# Altium schematic symbol library jlcpcb_2025_04_capacitors_extended_0402.schlib: 3594 symbols (part 10 of 20) (continued)
## CGA2B2C0G1H270JT0Y0F
designator C?  Capacitance: 27pF  (hidden comment: *)
Capacitor, Ceramic (MLCC), 27pF, ±5%, 50V, C0G, ±5%, SMD 0402; Manufacturer: TDK; Manufacturer Part Number: CGA2B2C0G1H270JT0Y0F; Package Size: 0402; JLCPCB Basic Part: No; JLCPCB Part Number: C342944; Supplier 1: LCSC; Category: Capacitors - MLCC; Supplier Part Number 1: C342944; Tolerance: ±5%; Voltage Rating: 50V; Temperature Coefficient: C0G; RoHS: Yes; ComponentLink1Description: Datasheet; ComponentLink1URL: https://wmsc.lcsc.com/wmsc/upload/file/pdf/v2/lcsc/2304140030_TDK-CGA2B2C0G1H270JT0Y0F_C342944.pdf; ComponentLink2Description: JLCPCB Part URL; ComponentLink2URL: https://jlcpcb.com/partdetail/C342944; ComponentLink3Description: LCSC Part URL; ComponentLink3URL: https://lcsc.com/product-detail/Multilayer-Ceramic-Capacitors-MLCC---SMD-SMT_TDK-TDK-CGA2B2C0G1H270JT0Y0F_C342944.html
footprint CAP-0402 (0402 (1005M) Capacitor)
pins: 1, 2

## CGA2B2C0G1H271JT0Y0F
designator C?  Capacitance: 270pF  (hidden comment: *)
Capacitor, Ceramic (MLCC), 270pF, ±5%, 50V, C0G, ±5%, SMD 0402; Manufacturer: TDK; Manufacturer Part Number: CGA2B2C0G1H271JT0Y0F; Package Size: 0402; JLCPCB Basic Part: No; JLCPCB Part Number: C695156; Supplier 1: LCSC; Category: Capacitors - MLCC; Supplier Part Number 1: C695156; Tolerance: ±5%; Voltage Rating: 50V; Temperature Coefficient: C0G; RoHS: Yes; ComponentLink1Description: Datasheet; ComponentLink1URL: https://wmsc.lcsc.com/wmsc/upload/file/pdf/v2/lcsc/2008101534_TDK-CGA2B2C0G1H271JT0Y0F_C695156.pdf; ComponentLink2Description: JLCPCB Part URL; ComponentLink2URL: https://jlcpcb.com/partdetail/C695156; ComponentLink3Description: LCSC Part URL; ComponentLink3URL: https://lcsc.com/product-detail/Multilayer-Ceramic-Capacitors-MLCC---SMD-SMT_TDK-TDK-CGA2B2C0G1H271JT0Y0F_C695156.html
footprint CAP-0402 (0402 (1005M) Capacitor)
pins: 1, 2

## CGA2B2C0G1H330JT0Y0F
designator C?  Capacitance: 33pF  (hidden comment: *)
Capacitor, Ceramic (MLCC), 33pF, ±5%, 50V, C0G, ±5%, SMD 0402; Manufacturer: TDK; Manufacturer Part Number: CGA2B2C0G1H330JT0Y0F; Package Size: 0402; JLCPCB Basic Part: No; JLCPCB Part Number: C342945; Supplier 1: LCSC; Category: Capacitors - MLCC; Supplier Part Number 1: C342945; Tolerance: ±5%; Voltage Rating: 50V; Temperature Coefficient: C0G; RoHS: Yes; ComponentLink1Description: Datasheet; ComponentLink1URL: https://wmsc.lcsc.com/wmsc/upload/file/pdf/v2/lcsc/2304140030_TDK-CGA2B2C0G1H330JT0Y0F_C342945.pdf; ComponentLink2Description: JLCPCB Part URL; ComponentLink2URL: https://jlcpcb.com/partdetail/C342945; ComponentLink3Description: LCSC Part URL; ComponentLink3URL: https://lcsc.com/product-detail/Multilayer-Ceramic-Capacitors-MLCC---SMD-SMT_TDK-TDK-CGA2B2C0G1H330JT0Y0F_C342945.html
footprint CAP-0402 (0402 (1005M) Capacitor)
pins: 1, 2

## CGA2B2C0G1H331JT0Y0F
designator C?  Capacitance: 330pF  (hidden comment: *)
Capacitor, Ceramic (MLCC), 330pF, ±5%, 50V, C0G, ±5%, SMD 0402; Manufacturer: TDK; Manufacturer Part Number: CGA2B2C0G1H331JT0Y0F; Package Size: 0402; JLCPCB Basic Part: No; JLCPCB Part Number: C343057; Supplier 1: LCSC; Category: Capacitors - MLCC; Supplier Part Number 1: C343057; Tolerance: ±5%; Voltage Rating: 50V; Temperature Coefficient: C0G; RoHS: Yes; ComponentLink1Description: Datasheet; ComponentLink1URL: https://wmsc.lcsc.com/wmsc/upload/file/pdf/v2/lcsc/2304140030_TDK-CGA2B2C0G1H331JT0Y0F_C343057.pdf; ComponentLink2Description: JLCPCB Part URL; ComponentLink2URL: https://jlcpcb.com/partdetail/C343057; ComponentLink3Description: LCSC Part URL; ComponentLink3URL: https://lcsc.com/product-detail/Multilayer-Ceramic-Capacitors-MLCC---SMD-SMT_TDK-TDK-CGA2B2C0G1H331JT0Y0F_C343057.html
footprint CAP-0402 (0402 (1005M) Capacitor)
pins: 1, 2

## CGA2B2C0G1H390JT0Y0F
designator C?  Capacitance: 39pF  (hidden comment: *)
Capacitor, Ceramic (MLCC), 39pF, ±5%, 50V, C0G, ±5%, SMD 0402; Manufacturer: TDK; Manufacturer Part Number: CGA2B2C0G1H390JT0Y0F; Package Size: 0402; JLCPCB Basic Part: No; JLCPCB Part Number: C342946; Supplier 1: LCSC; Category: Capacitors - MLCC; Supplier Part Number 1: C342946; Tolerance: ±5%; Voltage Rating: 50V; Temperature Coefficient: C0G; RoHS: Yes; ComponentLink1Description: Datasheet; ComponentLink1URL: https://wmsc.lcsc.com/wmsc/upload/file/pdf/v2/lcsc/2304140030_TDK-CGA2B2C0G1H390JT0Y0F_C342946.pdf; ComponentLink2Description: JLCPCB Part URL; ComponentLink2URL: https://jlcpcb.com/partdetail/C342946; ComponentLink3Description: LCSC Part URL; ComponentLink3URL: https://lcsc.com/product-detail/Multilayer-Ceramic-Capacitors-MLCC---SMD-SMT_TDK-TDK-CGA2B2C0G1H390JT0Y0F_C342946.html
footprint CAP-0402 (0402 (1005M) Capacitor)
pins: 1, 2

## CGA2B2C0G1H391JT0Y0F
designator C?  Capacitance: 390pF  (hidden comment: *)
Capacitor, Ceramic (MLCC), 390pF, ±5%, 50V, C0G, ±5%, SMD 0402; Manufacturer: TDK; Manufacturer Part Number: CGA2B2C0G1H391JT0Y0F; Package Size: 0402; JLCPCB Basic Part: No; JLCPCB Part Number: C445767; Supplier 1: LCSC; Category: Capacitors - MLCC; Supplier Part Number 1: C445767; Tolerance: ±5%; Voltage Rating: 50V; Temperature Coefficient: C0G; RoHS: Yes; ComponentLink1Description: Datasheet; ComponentLink1URL: https://wmsc.lcsc.com/wmsc/upload/file/pdf/v2/lcsc/2304140030_TDK-CGA2B2C0G1H391JT0Y0F_C445767.pdf; ComponentLink2Description: JLCPCB Part URL; ComponentLink2URL: https://jlcpcb.com/partdetail/C445767; ComponentLink3Description: LCSC Part URL; ComponentLink3URL: https://lcsc.com/product-detail/Multilayer-Ceramic-Capacitors-MLCC---SMD-SMT_TDK-TDK-CGA2B2C0G1H391JT0Y0F_C445767.html
footprint CAP-0402 (0402 (1005M) Capacitor)
pins: 1, 2

## CGA2B2C0G1H470JT0Y0F
designator C?  Capacitance: 47pF  (hidden comment: *)
Capacitor, Ceramic (MLCC), 47pF, ±5%, 50V, C0G, ±5%, SMD 0402; Manufacturer: TDK; Manufacturer Part Number: CGA2B2C0G1H470JT0Y0F; Package Size: 0402; JLCPCB Basic Part: No; JLCPCB Part Number: C432937; Supplier 1: LCSC; Category: Capacitors - MLCC; Supplier Part Number 1: C432937; Tolerance: ±5%; Voltage Rating: 50V; Temperature Coefficient: C0G; RoHS: Yes; ComponentLink1Description: Datasheet; ComponentLink1URL: https://wmsc.lcsc.com/wmsc/upload/file/pdf/v2/lcsc/2304140030_TDK-CGA2B2C0G1H470JT0Y0F_C432937.pdf; ComponentLink2Description: JLCPCB Part URL; ComponentLink2URL: https://jlcpcb.com/partdetail/C432937; ComponentLink3Description: LCSC Part URL; ComponentLink3URL: https://lcsc.com/product-detail/Multilayer-Ceramic-Capacitors-MLCC---SMD-SMT_TDK-TDK-CGA2B2C0G1H470JT0Y0F_C432937.html
footprint CAP-0402 (0402 (1005M) Capacitor)
pins: 1, 2

## CGA2B2C0G1H471JT0Y0F
designator C?  Capacitance: 470pF  (hidden comment: *)
Capacitor, Ceramic (MLCC), 470pF, ±5%, 50V, C0G, ±5%, SMD 0402; Manufacturer: TDK; Manufacturer Part Number: CGA2B2C0G1H471JT0Y0F; Package Size: 0402; JLCPCB Basic Part: No; JLCPCB Part Number: C445766; Supplier 1: LCSC; Category: Capacitors - MLCC; Supplier Part Number 1: C445766; Tolerance: ±5%; Voltage Rating: 50V; Temperature Coefficient: C0G; RoHS: Yes; ComponentLink1Description: Datasheet; ComponentLink1URL: https://wmsc.lcsc.com/wmsc/upload/file/pdf/v2/lcsc/2304140030_TDK-CGA2B2C0G1H471JT0Y0F_C445766.pdf; ComponentLink2Description: JLCPCB Part URL; ComponentLink2URL: https://jlcpcb.com/partdetail/C445766; ComponentLink3Description: LCSC Part URL; ComponentLink3URL: https://lcsc.com/product-detail/Multilayer-Ceramic-Capacitors-MLCC---SMD-SMT_TDK-TDK-CGA2B2C0G1H471JT0Y0F_C445766.html
footprint CAP-0402 (0402 (1005M) Capacitor)
pins: 1, 2

## CGA2B2C0G1H560JT0Y0F
designator C?  Capacitance: 56pF  (hidden comment: *)
Capacitor, Ceramic (MLCC), 56pF, ±5%, 50V, C0G, ±5%, SMD 0402; Manufacturer: TDK; Manufacturer Part Number: CGA2B2C0G1H560JT0Y0F; Package Size: 0402; JLCPCB Basic Part: No; JLCPCB Part Number: C342947; Supplier 1: LCSC; Category: Capacitors - MLCC; Supplier Part Number 1: C342947; Tolerance: ±5%; Voltage Rating: 50V; Temperature Coefficient: C0G; RoHS: Yes; ComponentLink1Description: Datasheet; ComponentLink1URL: https://wmsc.lcsc.com/wmsc/upload/file/pdf/v2/lcsc/2304140030_TDK-CGA2B2C0G1H560JT0Y0F_C342947.pdf; ComponentLink2Description: JLCPCB Part URL; ComponentLink2URL: https://jlcpcb.com/partdetail/C342947; ComponentLink3Description: LCSC Part URL; ComponentLink3URL: https://lcsc.com/product-detail/Multilayer-Ceramic-Capacitors-MLCC---SMD-SMT_TDK-TDK-CGA2B2C0G1H560JT0Y0F_C342947.html
footprint CAP-0402 (0402 (1005M) Capacitor)
pins: 1, 2

## CGA2B2C0G1H680JT0Y0F
designator C?  Capacitance: 68pF  (hidden comment: *)
Capacitor, Ceramic (MLCC), 68pF, ±5%, 50V, C0G, ±5%, SMD 0402; Manufacturer: TDK; Manufacturer Part Number: CGA2B2C0G1H680JT0Y0F; Package Size: 0402; JLCPCB Basic Part: No; JLCPCB Part Number: C342948; Supplier 1: LCSC; Category: Capacitors - MLCC; Supplier Part Number 1: C342948; Tolerance: ±5%; Voltage Rating: 50V; Temperature Coefficient: C0G; RoHS: Yes; ComponentLink1Description: Datasheet; ComponentLink1URL: https://wmsc.lcsc.com/wmsc/upload/file/pdf/v2/lcsc/2304140030_TDK-CGA2B2C0G1H680JT0Y0F_C342948.pdf; ComponentLink2Description: JLCPCB Part URL; ComponentLink2URL: https://jlcpcb.com/partdetail/C342948; ComponentLink3Description: LCSC Part URL; ComponentLink3URL: https://lcsc.com/product-detail/Multilayer-Ceramic-Capacitors-MLCC---SMD-SMT_TDK-TDK-CGA2B2C0G1H680JT0Y0F_C342948.html
footprint CAP-0402 (0402 (1005M) Capacitor)
pins: 1, 2

## CGA2B2C0G1H681JT0Y0F
designator C?  Capacitance: 680pF  (hidden comment: *)
Capacitor, Ceramic (MLCC), 680pF, ±5%, 50V, C0G, ±5%, SMD 0402; Manufacturer: TDK; Manufacturer Part Number: CGA2B2C0G1H681JT0Y0F; Package Size: 0402; JLCPCB Basic Part: No; JLCPCB Part Number: C338094; Supplier 1: LCSC; Category: Capacitors - MLCC; Supplier Part Number 1: C338094; Tolerance: ±5%; Voltage Rating: 50V; Temperature Coefficient: C0G; RoHS: Yes; ComponentLink1Description: Datasheet; ComponentLink1URL: https://wmsc.lcsc.com/wmsc/upload/file/pdf/v2/lcsc/2304140030_TDK-CGA2B2C0G1H681JT0Y0F_C338094.pdf; ComponentLink2Description: JLCPCB Part URL; ComponentLink2URL: https://jlcpcb.com/partdetail/C338094; ComponentLink3Description: LCSC Part URL; ComponentLink3URL: https://lcsc.com/product-detail/Multilayer-Ceramic-Capacitors-MLCC---SMD-SMT_TDK-TDK-CGA2B2C0G1H681JT0Y0F_C338094.html
footprint CAP-0402 (0402 (1005M) Capacitor)
pins: 1, 2

## CGA2B2C0G1H821JT0Y0F
designator C?  Capacitance: 820pF  (hidden comment: *)
Capacitor, Ceramic (MLCC), 820pF, ±5%, 50V, C0G, ±5%, SMD 0402; Manufacturer: TDK; Manufacturer Part Number: CGA2B2C0G1H821JT0Y0F; Package Size: 0402; JLCPCB Basic Part: No; JLCPCB Part Number: C695380; Supplier 1: LCSC; Category: Capacitors - MLCC; Supplier Part Number 1: C695380; Tolerance: ±5%; Voltage Rating: 50V; Temperature Coefficient: C0G; RoHS: Yes; ComponentLink1Description: Datasheet; ComponentLink1URL: https://wmsc.lcsc.com/wmsc/upload/file/pdf/v2/lcsc/2304140030_TDK-CGA2B2C0G1H821JT0Y0F_C695380.pdf; ComponentLink2Description: JLCPCB Part URL; ComponentLink2URL: https://jlcpcb.com/partdetail/C695380; ComponentLink3Description: LCSC Part URL; ComponentLink3URL: https://lcsc.com/product-detail/Multilayer-Ceramic-Capacitors-MLCC---SMD-SMT_TDK-TDK-CGA2B2C0G1H821JT0Y0F_C695380.html
footprint CAP-0402 (0402 (1005M) Capacitor)
pins: 1, 2

## CGA2B2C0G2A101JT0Y0F
designator C?  Capacitance: 100pF  (hidden comment: *)
Capacitor, Ceramic (MLCC), 100pF, ±5%, 100V, C0G, ±5%, SMD 0402; Manufacturer: TDK; Manufacturer Part Number: CGA2B2C0G2A101JT0Y0F; Package Size: 0402; JLCPCB Basic Part: No; JLCPCB Part Number: C531423; Supplier 1: LCSC; Category: Capacitors - MLCC; Supplier Part Number 1: C531423; Tolerance: ±5%; Voltage Rating: 100V; Temperature Coefficient: C0G; RoHS: Yes; ComponentLink1Description: Datasheet; ComponentLink2Description: JLCPCB Part URL; ComponentLink2URL: https://jlcpcb.com/partdetail/C531423; ComponentLink3Description: LCSC Part URL; ComponentLink3URL: https://lcsc.com/product-detail/Multilayer-Ceramic-Capacitors-MLCC---SMD-SMT_TDK-TDK-CGA2B2C0G2A101JT0Y0F_C531423.html
footprint CAP-0402 (0402 (1005M) Capacitor)
pins: 1, 2

## CGA2B2NP01H100DT0Y0F
designator C?  Capacitance: 10pF  (hidden comment: *)
Capacitor, Ceramic (MLCC), 10pF, 50V, NP0, SMD 0402; Manufacturer: TDK; Manufacturer Part Number: CGA2B2NP01H100DT0Y0F; Package Size: 0402; JLCPCB Basic Part: No; JLCPCB Part Number: C694492; Supplier 1: LCSC; Category: Capacitors - MLCC; Supplier Part Number 1: C694492; Voltage Rating: 50V; Temperature Coefficient: NP0; RoHS: Yes; ComponentLink1Description: Datasheet; ComponentLink1URL: https://wmsc.lcsc.com/wmsc/upload/file/pdf/v2/lcsc/2304140030_TDK-CGA2B2NP01H100DT0Y0F_C694492.pdf; ComponentLink2Description: JLCPCB Part URL; ComponentLink2URL: https://jlcpcb.com/partdetail/C694492; ComponentLink3Description: LCSC Part URL; ComponentLink3URL: https://lcsc.com/product-detail/Multilayer-Ceramic-Capacitors-MLCC---SMD-SMT_TDK-TDK-CGA2B2NP01H100DT0Y0F_C694492.html
footprint CAP-0402 (0402 (1005M) Capacitor)
pins: 1, 2

## CGA2B2NP01H680JT0Y0F
designator C?  Capacitance: 68pF  (hidden comment: *)
Capacitor, Ceramic (MLCC), 68pF, ±5%, 50V, NP0, ±5%, SMD 0402; Manufacturer: TDK; Manufacturer Part Number: CGA2B2NP01H680JT0Y0F; Package Size: 0402; JLCPCB Basic Part: No; JLCPCB Part Number: C694213; Supplier 1: LCSC; Category: Capacitors - MLCC; Supplier Part Number 1: C694213; Tolerance: ±5%; Voltage Rating: 50V; Temperature Coefficient: NP0; RoHS: Yes; ComponentLink1Description: Datasheet; ComponentLink1URL: https://wmsc.lcsc.com/wmsc/upload/file/pdf/v2/lcsc/2304140030_TDK-CGA2B2NP01H680JT0Y0F_C694213.pdf; ComponentLink2Description: JLCPCB Part URL; ComponentLink2URL: https://jlcpcb.com/partdetail/C694213; ComponentLink3Description: LCSC Part URL; ComponentLink3URL: https://lcsc.com/product-detail/Multilayer-Ceramic-Capacitors-MLCC---SMD-SMT_TDK-TDK-CGA2B2NP01H680JT0Y0F_C694213.html
footprint CAP-0402 (0402 (1005M) Capacitor)
pins: 1, 2

## CGA2B2X7R1C224KT000F
designator C?  Capacitance: 220nF  (hidden comment: *)
Capacitor, Ceramic (MLCC), 220nF, ±10%, 16V, X7R, ±10%, SMD 0402; Manufacturer: TDK; Manufacturer Part Number: CGA2B2X7R1C224KT000F; Package Size: 0402; JLCPCB Basic Part: No; JLCPCB Part Number: C338106; Supplier 1: LCSC; Category: Capacitors - MLCC; Supplier Part Number 1: C338106; Tolerance: ±10%; Voltage Rating: 16V; Temperature Coefficient: X7R; RoHS: Yes; ComponentLink1Description: Datasheet; ComponentLink1URL: https://wmsc.lcsc.com/wmsc/upload/file/pdf/v2/lcsc/2304140030_TDK-CGA2B2X7R1C224KT000F_C338106.pdf; ComponentLink2Description: JLCPCB Part URL; ComponentLink2URL: https://jlcpcb.com/partdetail/C338106; ComponentLink3Description: LCSC Part URL; ComponentLink3URL: https://lcsc.com/product-detail/Multilayer-Ceramic-Capacitors-MLCC---SMD-SMT_TDK-TDK-CGA2B2X7R1C224KT000F_C338106.html
footprint CAP-0402 (0402 (1005M) Capacitor)
pins: 1, 2

## CGA2B2X7R1C473KT0Y0F
designator C?  Capacitance: 47nF  (hidden comment: *)
Capacitor, Ceramic (MLCC), 47nF, ±10%, 16V, X7R, ±10%, SMD 0402; Manufacturer: TDK; Manufacturer Part Number: CGA2B2X7R1C473KT0Y0F; Package Size: 0402; JLCPCB Basic Part: No; JLCPCB Part Number: C508865; Supplier 1: LCSC; Category: Capacitors - MLCC; Supplier Part Number 1: C508865; Tolerance: ±10%; Voltage Rating: 16V; Temperature Coefficient: X7R; RoHS: Yes; ComponentLink1Description: Datasheet; ComponentLink1URL: https://wmsc.lcsc.com/wmsc/upload/file/pdf/v2/lcsc/2304140030_TDK-CGA2B2X7R1C473KT0Y0F_C508865.pdf; ComponentLink2Description: JLCPCB Part URL; ComponentLink2URL: https://jlcpcb.com/partdetail/C508865; ComponentLink3Description: LCSC Part URL; ComponentLink3URL: https://lcsc.com/product-detail/Multilayer-Ceramic-Capacitors-MLCC---SMD-SMT_TDK-TDK-CGA2B2X7R1C473KT0Y0F_C508865.html
footprint CAP-0402 (0402 (1005M) Capacitor)
pins: 1, 2

## CGA2B2X7R1E103KT0Y0F
designator C?  Capacitance: 10nF  (hidden comment: *)
Capacitor, Ceramic (MLCC), 10nF, ±10%, 25V, X7R, ±10%, SMD 0402; Manufacturer: TDK; Manufacturer Part Number: CGA2B2X7R1E103KT0Y0F; Package Size: 0402; JLCPCB Basic Part: No; JLCPCB Part Number: C76702; Supplier 1: LCSC; Category: Capacitors - MLCC; Supplier Part Number 1: C76702; Tolerance: ±10%; Voltage Rating: 25V; Temperature Coefficient: X7R; RoHS: Yes; ComponentLink1Description: Datasheet; ComponentLink1URL: https://wmsc.lcsc.com/wmsc/upload/file/pdf/v2/lcsc/2304140030_TDK-CGA2B2X7R1E103KT0Y0F_C76702.pdf; ComponentLink2Description: JLCPCB Part URL; ComponentLink2URL: https://jlcpcb.com/partdetail/C76702; ComponentLink3Description: LCSC Part URL; ComponentLink3URL: https://lcsc.com/product-detail/Multilayer-Ceramic-Capacitors-MLCC---SMD-SMT_TDK-TDK-CGA2B2X7R1E103KT0Y0F_C76702.html
footprint CAP-0402 (0402 (1005M) Capacitor)
pins: 1, 2

## CGA2B2X7R1E223KT0Y0F
designator C?  Capacitance: 22nF  (hidden comment: *)
Capacitor, Ceramic (MLCC), 22nF, ±10%, 25V, X7R, ±10%, SMD 0402; Manufacturer: TDK; Manufacturer Part Number: CGA2B2X7R1E223KT0Y0F; Package Size: 0402; JLCPCB Basic Part: No; JLCPCB Part Number: C76703; Supplier 1: LCSC; Category: Capacitors - MLCC; Supplier Part Number 1: C76703; Tolerance: ±10%; Voltage Rating: 25V; Temperature Coefficient: X7R; RoHS: Yes; ComponentLink1Description: Datasheet; ComponentLink1URL: https://wmsc.lcsc.com/wmsc/upload/file/pdf/v2/lcsc/2304140030_TDK-CGA2B2X7R1E223KT0Y0F_C76703.pdf; ComponentLink2Description: JLCPCB Part URL; ComponentLink2URL: https://jlcpcb.com/partdetail/C76703; ComponentLink3Description: LCSC Part URL; ComponentLink3URL: https://lcsc.com/product-detail/Multilayer-Ceramic-Capacitors-MLCC---SMD-SMT_TDK-TDK-CGA2B2X7R1E223KT0Y0F_C76703.html
footprint CAP-0402 (0402 (1005M) Capacitor)
pins: 1, 2

## CGA2B2X7R1H102KT0Y0F
designator C?  Capacitance: 1nF  (hidden comment: *)
Capacitor, Ceramic (MLCC), 1nF, ±10%, 50V, X7R, ±10%, SMD 0402; Manufacturer: TDK; Manufacturer Part Number: CGA2B2X7R1H102KT0Y0F; Package Size: 0402; JLCPCB Basic Part: No; JLCPCB Part Number: C76704; Supplier 1: LCSC; Category: Capacitors - MLCC; Supplier Part Number 1: C76704; Tolerance: ±10%; Voltage Rating: 50V; Temperature Coefficient: X7R; RoHS: Yes; ComponentLink1Description: Datasheet; ComponentLink1URL: https://wmsc.lcsc.com/wmsc/upload/file/pdf/v2/lcsc/2304140030_TDK-CGA2B2X7R1H102KT0Y0F_C76704.pdf; ComponentLink2Description: JLCPCB Part URL; ComponentLink2URL: https://jlcpcb.com/partdetail/C76704; ComponentLink3Description: LCSC Part URL; ComponentLink3URL: https://lcsc.com/product-detail/Multilayer-Ceramic-Capacitors-MLCC---SMD-SMT_TDK-TDK-CGA2B2X7R1H102KT0Y0F_C76704.html
footprint CAP-0402 (0402 (1005M) Capacitor)
pins: 1, 2

## CGA2B2X7R1H102KT0Y0S
designator C?  Capacitance: 1nF  (hidden comment: *)
Capacitor, Ceramic (MLCC), 1nF, ±10%, 50V, X7R, ±10%, SMD 0402; Manufacturer: TDK; Manufacturer Part Number: CGA2B2X7R1H102KT0Y0S; Package Size: 0402; JLCPCB Basic Part: No; JLCPCB Part Number: C694214; Supplier 1: LCSC; Category: Capacitors - MLCC; Supplier Part Number 1: C694214; Tolerance: ±10%; Voltage Rating: 50V; Temperature Coefficient: X7R; RoHS: Yes; ComponentLink1Description: Datasheet; ComponentLink1URL: https://wmsc.lcsc.com/wmsc/upload/file/pdf/v2/lcsc/2304140030_TDK-CGA2B2X7R1H102KT0Y0S_C694214.pdf; ComponentLink2Description: JLCPCB Part URL; ComponentLink2URL: https://jlcpcb.com/partdetail/C694214; ComponentLink3Description: LCSC Part URL; ComponentLink3URL: https://lcsc.com/product-detail/Multilayer-Ceramic-Capacitors-MLCC---SMD-SMT_TDK-TDK-CGA2B2X7R1H102KT0Y0S_C694214.html
footprint CAP-0402 (0402 (1005M) Capacitor)
pins: 1, 2

## CGA2B2X7R1H152KT0Y0F
designator C?  Capacitance: 1.5nF  (hidden comment: *)
Capacitor, Ceramic (MLCC), 1.5nF, ±10%, 50V, X7R, ±10%, SMD 0402; Manufacturer: TDK; Manufacturer Part Number: CGA2B2X7R1H152KT0Y0F; Package Size: 0402; JLCPCB Basic Part: No; JLCPCB Part Number: C694215; Supplier 1: LCSC; Category: Capacitors - MLCC; Supplier Part Number 1: C694215; Tolerance: ±10%; Voltage Rating: 50V; Temperature Coefficient: X7R; RoHS: Yes; ComponentLink1Description: Datasheet; ComponentLink1URL: https://wmsc.lcsc.com/wmsc/upload/file/pdf/v2/lcsc/2304140030_TDK-CGA2B2X7R1H152KT0Y0F_C694215.pdf; ComponentLink2Description: JLCPCB Part URL; ComponentLink2URL: https://jlcpcb.com/partdetail/C694215; ComponentLink3Description: LCSC Part URL; ComponentLink3URL: https://lcsc.com/product-detail/Multilayer-Ceramic-Capacitors-MLCC---SMD-SMT_TDK-TDK-CGA2B2X7R1H152KT0Y0F_C694215.html
footprint CAP-0402 (0402 (1005M) Capacitor)
pins: 1, 2

## CGA2B2X7R1H222K050BA
designator C?  Capacitance: 2.2nF  (hidden comment: *)
Capacitor, Ceramic (MLCC), 2.2nF, ±10%, 50V, X7R, ±10%, SMD 0402; Manufacturer: TDK; Manufacturer Part Number: CGA2B2X7R1H222K050BA; Package Size: 0402; JLCPCB Basic Part: No; JLCPCB Part Number: C2168697; Supplier 1: LCSC; Category: Capacitors - MLCC; Supplier Part Number 1: C2168697; Tolerance: ±10%; Voltage Rating: 50V; Temperature Coefficient: X7R; RoHS: Yes; ComponentLink1Description: Datasheet; ComponentLink1URL: https://wmsc.lcsc.com/wmsc/upload/file/pdf/v2/lcsc/2304140030_TDK-CGA2B2X7R1H222K050BA_C2168697.pdf; ComponentLink2Description: JLCPCB Part URL; ComponentLink2URL: https://jlcpcb.com/partdetail/C2168697; ComponentLink3Description: LCSC Part URL; ComponentLink3URL: https://lcsc.com/product-detail/Multilayer-Ceramic-Capacitors-MLCC---SMD-SMT_TDK-TDK-CGA2B2X7R1H222K050BA_C2168697.html
footprint CAP-0402 (0402 (1005M) Capacitor)
pins: 1, 2

## CGA2B2X7R1H222KT0Y0F
designator C?  Capacitance: 2.2nF  (hidden comment: *)
Capacitor, Ceramic (MLCC), 2.2nF, ±10%, 50V, X7R, ±10%, SMD 0402; Manufacturer: TDK; Manufacturer Part Number: CGA2B2X7R1H222KT0Y0F; Package Size: 0402; JLCPCB Basic Part: No; JLCPCB Part Number: C338081; Supplier 1: LCSC; Category: Capacitors - MLCC; Supplier Part Number 1: C338081; Tolerance: ±10%; Voltage Rating: 50V; Temperature Coefficient: X7R; RoHS: Yes; ComponentLink1Description: Datasheet; ComponentLink1URL: https://wmsc.lcsc.com/wmsc/upload/file/pdf/v2/lcsc/2304140030_TDK-CGA2B2X7R1H222KT0Y0F_C338081.pdf; ComponentLink2Description: JLCPCB Part URL; ComponentLink2URL: https://jlcpcb.com/partdetail/C338081; ComponentLink3Description: LCSC Part URL; ComponentLink3URL: https://lcsc.com/product-detail/Multilayer-Ceramic-Capacitors-MLCC---SMD-SMT_TDK-TDK-CGA2B2X7R1H222KT0Y0F_C338081.html
footprint CAP-0402 (0402 (1005M) Capacitor)
pins: 1, 2

## CGA2B2X7R1H332KT0Y0F
designator C?  Capacitance: 3.3nF  (hidden comment: *)
Capacitor, Ceramic (MLCC), 3.3nF, ±10%, 50V, X7R, ±10%, SMD 0402; Manufacturer: TDK; Manufacturer Part Number: CGA2B2X7R1H332KT0Y0F; Package Size: 0402; JLCPCB Basic Part: No; JLCPCB Part Number: C338095; Supplier 1: LCSC; Category: Capacitors - MLCC; Supplier Part Number 1: C338095; Tolerance: ±10%; Voltage Rating: 50V; Temperature Coefficient: X7R; RoHS: Yes; ComponentLink1Description: Datasheet; ComponentLink1URL: https://wmsc.lcsc.com/wmsc/upload/file/pdf/v2/lcsc/2304140030_TDK-CGA2B2X7R1H332KT0Y0F_C338095.pdf; ComponentLink2Description: JLCPCB Part URL; ComponentLink2URL: https://jlcpcb.com/partdetail/C338095; ComponentLink3Description: LCSC Part URL; ComponentLink3URL: https://lcsc.com/product-detail/Multilayer-Ceramic-Capacitors-MLCC---SMD-SMT_TDK-TDK-CGA2B2X7R1H332KT0Y0F_C338095.html
footprint CAP-0402 (0402 (1005M) Capacitor)
pins: 1, 2

## CGA2B2X7R1H471KT0Y0F
designator C?  Capacitance: 470pF  (hidden comment: *)
Capacitor, Ceramic (MLCC), 470pF, ±10%, 50V, X7R, ±10%, SMD 0402; Manufacturer: TDK; Manufacturer Part Number: CGA2B2X7R1H471KT0Y0F; Package Size: 0402; JLCPCB Basic Part: No; JLCPCB Part Number: C342932; Supplier 1: LCSC; Category: Capacitors - MLCC; Supplier Part Number 1: C342932; Tolerance: ±10%; Voltage Rating: 50V; Temperature Coefficient: X7R; RoHS: Yes; ComponentLink1Description: Datasheet; ComponentLink1URL: https://wmsc.lcsc.com/wmsc/upload/file/pdf/v2/lcsc/2304140030_TDK-CGA2B2X7R1H471KT0Y0F_C342932.pdf; ComponentLink2Description: JLCPCB Part URL; ComponentLink2URL: https://jlcpcb.com/partdetail/C342932; ComponentLink3Description: LCSC Part URL; ComponentLink3URL: https://lcsc.com/product-detail/Multilayer-Ceramic-Capacitors-MLCC---SMD-SMT_TDK-TDK-CGA2B2X7R1H471KT0Y0F_C342932.html
footprint CAP-0402 (0402 (1005M) Capacitor)
pins: 1, 2

## CGA2B2X7R1H472KT0Y0F
designator C?  Capacitance: 4.7nF  (hidden comment: *)
Capacitor, Ceramic (MLCC), 4.7nF, ±10%, 50V, X7R, ±10%, SMD 0402; Manufacturer: TDK; Manufacturer Part Number: CGA2B2X7R1H472KT0Y0F; Package Size: 0402; JLCPCB Basic Part: No; JLCPCB Part Number: C342933; Supplier 1: LCSC; Category: Capacitors - MLCC; Supplier Part Number 1: C342933; Tolerance: ±10%; Voltage Rating: 50V; Temperature Coefficient: X7R; RoHS: Yes; ComponentLink1Description: Datasheet; ComponentLink1URL: https://wmsc.lcsc.com/wmsc/upload/file/pdf/v2/lcsc/1912111437_TDK-CGA2B2X7R1H472KT0Y0F_C342933.pdf; ComponentLink2Description: JLCPCB Part URL; ComponentLink2URL: https://jlcpcb.com/partdetail/C342933; ComponentLink3Description: LCSC Part URL; ComponentLink3URL: https://lcsc.com/product-detail/Multilayer-Ceramic-Capacitors-MLCC---SMD-SMT_TDK-TDK-CGA2B2X7R1H472KT0Y0F_C342933.html
footprint CAP-0402 (0402 (1005M) Capacitor)
pins: 1, 2

## CGA2B2X7R1H472KT0Y0S
designator C?  Capacitance: 4.7nF  (hidden comment: *)
Capacitor, Ceramic (MLCC), 4.7nF, ±10%, 50V, X7R, ±10%, SMD 0402; Manufacturer: TDK; Manufacturer Part Number: CGA2B2X7R1H472KT0Y0S; Package Size: 0402; JLCPCB Basic Part: No; JLCPCB Part Number: C694216; Supplier 1: LCSC; Category: Capacitors - MLCC; Supplier Part Number 1: C694216; Tolerance: ±10%; Voltage Rating: 50V; Temperature Coefficient: X7R; RoHS: Yes; ComponentLink1Description: Datasheet; ComponentLink1URL: https://wmsc.lcsc.com/wmsc/upload/file/pdf/v2/lcsc/2304140030_TDK-CGA2B2X7R1H472KT0Y0S_C694216.pdf; ComponentLink2Description: JLCPCB Part URL; ComponentLink2URL: https://jlcpcb.com/partdetail/C694216; ComponentLink3Description: LCSC Part URL; ComponentLink3URL: https://lcsc.com/product-detail/Multilayer-Ceramic-Capacitors-MLCC---SMD-SMT_TDK-TDK-CGA2B2X7R1H472KT0Y0S_C694216.html
footprint CAP-0402 (0402 (1005M) Capacitor)
pins: 1, 2

## CGA2B2X7R1H682KT0Y0F
designator C?  Capacitance: 6.8nF  (hidden comment: *)
Capacitor, Ceramic (MLCC), 6.8nF, ±10%, 50V, X7R, ±10%, SMD 0402; Manufacturer: TDK; Manufacturer Part Number: CGA2B2X7R1H682KT0Y0F; Package Size: 0402; JLCPCB Basic Part: No; JLCPCB Part Number: C445768; Supplier 1: LCSC; Category: Capacitors - MLCC; Supplier Part Number 1: C445768; Tolerance: ±10%; Voltage Rating: 50V; Temperature Coefficient: X7R; RoHS: Yes; ComponentLink1Description: Datasheet; ComponentLink1URL: https://wmsc.lcsc.com/wmsc/upload/file/pdf/v2/lcsc/2304140030_TDK-CGA2B2X7R1H682KT0Y0F_C445768.pdf; ComponentLink2Description: JLCPCB Part URL; ComponentLink2URL: https://jlcpcb.com/partdetail/C445768; ComponentLink3Description: LCSC Part URL; ComponentLink3URL: https://lcsc.com/product-detail/Multilayer-Ceramic-Capacitors-MLCC---SMD-SMT_TDK-TDK-CGA2B2X7R1H682KT0Y0F_C445768.html
footprint CAP-0402 (0402 (1005M) Capacitor)
pins: 1, 2

## CGA2B2X8R2A221K050BA
designator C?  Capacitance: 220pF  (hidden comment: *)
Capacitor, Ceramic (MLCC), 220pF, ±10%, 100V, X8R, ±10%, SMD 0402; Manufacturer: TDK; Manufacturer Part Number: CGA2B2X8R2A221K050BA; Package Size: 0402; JLCPCB Basic Part: No; JLCPCB Part Number: C2176993; Supplier 1: LCSC; Category: Capacitors - MLCC; Supplier Part Number 1: C2176993; Tolerance: ±10%; Voltage Rating: 100V; Temperature Coefficient: X8R; RoHS: Yes; ComponentLink1Description: Datasheet; ComponentLink1URL: https://wmsc.lcsc.com/wmsc/upload/file/pdf/v2/lcsc/2304140030_TDK-CGA2B2X8R2A221K050BA_C2176993.pdf; ComponentLink2Description: JLCPCB Part URL; ComponentLink2URL: https://jlcpcb.com/partdetail/C2176993; ComponentLink3Description: LCSC Part URL; ComponentLink3URL: https://lcsc.com/product-detail/Multilayer-Ceramic-Capacitors-MLCC---SMD-SMT_TDK-TDK-CGA2B2X8R2A221K050BA_C2176993.html
footprint CAP-0402 (0402 (1005M) Capacitor)
pins: 1, 2

## CGA2B3X7R1E104KT0Y0F
designator C?  Capacitance: 100nF  (hidden comment: *)
Capacitor, Ceramic (MLCC), 100nF, ±10%, 25V, X7R, ±10%, SMD 0402; Manufacturer: TDK; Manufacturer Part Number: CGA2B3X7R1E104KT0Y0F; Package Size: 0402; JLCPCB Basic Part: No; JLCPCB Part Number: C338112; Supplier 1: LCSC; Category: Capacitors - MLCC; Supplier Part Number 1: C338112; Tolerance: ±10%; Voltage Rating: 25V; Temperature Coefficient: X7R; RoHS: Yes; ComponentLink1Description: Datasheet; ComponentLink1URL: https://wmsc.lcsc.com/wmsc/upload/file/pdf/v2/lcsc/2304140030_TDK-CGA2B3X7R1E104KT0Y0F_C338112.pdf; ComponentLink2Description: JLCPCB Part URL; ComponentLink2URL: https://jlcpcb.com/partdetail/C338112; ComponentLink3Description: LCSC Part URL; ComponentLink3URL: https://lcsc.com/product-detail/Multilayer-Ceramic-Capacitors-MLCC---SMD-SMT_TDK-TDK-CGA2B3X7R1E104KT0Y0F_C338112.html
footprint CAP-0402 (0402 (1005M) Capacitor)
pins: 1, 2

## CGA2B3X7R1E224KT000F
designator C?  Capacitance: 220nF  (hidden comment: *)
Capacitor, Ceramic (MLCC), 220nF, ±10%, 25V, X7R, ±10%, SMD 0402; Manufacturer: TDK; Manufacturer Part Number: CGA2B3X7R1E224KT000F; Package Size: 0402; JLCPCB Basic Part: No; JLCPCB Part Number: C531424; Supplier 1: LCSC; Category: Capacitors - MLCC; Supplier Part Number 1: C531424; Tolerance: ±10%; Voltage Rating: 25V; Temperature Coefficient: X7R; RoHS: Yes; ComponentLink1Description: Datasheet; ComponentLink1URL: https://wmsc.lcsc.com/wmsc/upload/file/pdf/v2/lcsc/2304140030_TDK-CGA2B3X7R1E224KT000F_C531424.pdf; ComponentLink2Description: JLCPCB Part URL; ComponentLink2URL: https://jlcpcb.com/partdetail/C531424; ComponentLink3Description: LCSC Part URL; ComponentLink3URL: https://lcsc.com/product-detail/Multilayer-Ceramic-Capacitors-MLCC---SMD-SMT_TDK-TDK-CGA2B3X7R1E224KT000F_C531424.html
footprint CAP-0402 (0402 (1005M) Capacitor)
pins: 1, 2

## CGA2B3X7R1H103KT0Y0F
designator C?  Capacitance: 10nF  (hidden comment: *)
Capacitor, Ceramic (MLCC), 10nF, ±10%, 50V, X7R, ±10%, SMD 0402; Manufacturer: TDK; Manufacturer Part Number: CGA2B3X7R1H103KT0Y0F; Package Size: 0402; JLCPCB Basic Part: No; JLCPCB Part Number: C76705; Supplier 1: LCSC; Category: Capacitors - MLCC; Supplier Part Number 1: C76705; Tolerance: ±10%; Voltage Rating: 50V; Temperature Coefficient: X7R; RoHS: Yes; ComponentLink1Description: Datasheet; ComponentLink1URL: https://wmsc.lcsc.com/wmsc/upload/file/pdf/v2/lcsc/2304140030_TDK-CGA2B3X7R1H103KT0Y0F_C76705.pdf; ComponentLink2Description: JLCPCB Part URL; ComponentLink2URL: https://jlcpcb.com/partdetail/C76705; ComponentLink3Description: LCSC Part URL; ComponentLink3URL: https://lcsc.com/product-detail/Multilayer-Ceramic-Capacitors-MLCC---SMD-SMT_TDK-TDK-CGA2B3X7R1H103KT0Y0F_C76705.html
footprint CAP-0402 (0402 (1005M) Capacitor)
pins: 1, 2

## CGA2B3X7R1H104KT0Y0F
designator C?  Capacitance: 100nF  (hidden comment: *)
Capacitor, Ceramic (MLCC), 100nF, ±10%, 50V, X7R, ±10%, SMD 0402; Manufacturer: TDK; Manufacturer Part Number: CGA2B3X7R1H104KT0Y0F; Package Size: 0402; JLCPCB Basic Part: No; JLCPCB Part Number: C343042; Supplier 1: LCSC; Category: Capacitors - MLCC; Supplier Part Number 1: C343042; Tolerance: ±10%; Voltage Rating: 50V; Temperature Coefficient: X7R; RoHS: Yes; ComponentLink1Description: Datasheet; ComponentLink1URL: https://wmsc.lcsc.com/wmsc/upload/file/pdf/v2/lcsc/2304140030_TDK-CGA2B3X7R1H104KT0Y0F_C343042.pdf; ComponentLink2Description: JLCPCB Part URL; ComponentLink2URL: https://jlcpcb.com/partdetail/C343042; ComponentLink3Description: LCSC Part URL; ComponentLink3URL: https://lcsc.com/product-detail/Multilayer-Ceramic-Capacitors-MLCC---SMD-SMT_TDK-TDK-CGA2B3X7R1H104KT0Y0F_C343042.html
footprint CAP-0402 (0402 (1005M) Capacitor)
pins: 1, 2

## CGA2B3X7R1H223KT0Y0F
designator C?  Capacitance: 22nF  (hidden comment: *)
Capacitor, Ceramic (MLCC), 22nF, ±10%, 50V, X7R, ±10%, SMD 0402; Manufacturer: TDK; Manufacturer Part Number: CGA2B3X7R1H223KT0Y0F; Package Size: 0402; JLCPCB Basic Part: No; JLCPCB Part Number: C343052; Supplier 1: LCSC; Category: Capacitors - MLCC; Supplier Part Number 1: C343052; Tolerance: ±10%; Voltage Rating: 50V; Temperature Coefficient: X7R; RoHS: Yes; ComponentLink1Description: Datasheet; ComponentLink1URL: https://wmsc.lcsc.com/wmsc/upload/file/pdf/v2/lcsc/2108132230_TDK-CGA2B3X7R1H223KT0Y0F_C343052.pdf; ComponentLink2Description: JLCPCB Part URL; ComponentLink2URL: https://jlcpcb.com/partdetail/C343052; ComponentLink3Description: LCSC Part URL; ComponentLink3URL: https://lcsc.com/product-detail/Multilayer-Ceramic-Capacitors-MLCC---SMD-SMT_TDK-TDK-CGA2B3X7R1H223KT0Y0F_C343052.html
footprint CAP-0402 (0402 (1005M) Capacitor)
pins: 1, 2

## CGA2B3X7R1H333KT0Y0F
designator C?  Capacitance: 33nF  (hidden comment: *)
Capacitor, Ceramic (MLCC), 33nF, ±10%, 50V, X7R, ±10%, SMD 0402; Manufacturer: TDK; Manufacturer Part Number: CGA2B3X7R1H333KT0Y0F; Package Size: 0402; JLCPCB Basic Part: No; JLCPCB Part Number: C343050; Supplier 1: LCSC; Category: Capacitors - MLCC; Supplier Part Number 1: C343050; Tolerance: ±10%; Voltage Rating: 50V; Temperature Coefficient: X7R; RoHS: Yes; ComponentLink1Description: Datasheet; ComponentLink1URL: https://wmsc.lcsc.com/wmsc/upload/file/pdf/v2/lcsc/2304140030_TDK-CGA2B3X7R1H333KT0Y0F_C343050.pdf; ComponentLink2Description: JLCPCB Part URL; ComponentLink2URL: https://jlcpcb.com/partdetail/C343050; ComponentLink3Description: LCSC Part URL; ComponentLink3URL: https://lcsc.com/product-detail/Multilayer-Ceramic-Capacitors-MLCC---SMD-SMT_TDK-TDK-CGA2B3X7R1H333KT0Y0F_C343050.html
footprint CAP-0402 (0402 (1005M) Capacitor)
pins: 1, 2

## CGA2B3X7R1H473KT0Y0F
designator C?  Capacitance: 47nF  (hidden comment: *)
Capacitor, Ceramic (MLCC), 47nF, ±10%, 50V, X7R, ±10%, SMD 0402; Manufacturer: TDK; Manufacturer Part Number: CGA2B3X7R1H473KT0Y0F; Package Size: 0402; JLCPCB Basic Part: No; JLCPCB Part Number: C343051; Supplier 1: LCSC; Category: Capacitors - MLCC; Supplier Part Number 1: C343051; Tolerance: ±10%; Voltage Rating: 50V; Temperature Coefficient: X7R; RoHS: Yes; ComponentLink1Description: Datasheet; ComponentLink1URL: https://wmsc.lcsc.com/wmsc/upload/file/pdf/v2/lcsc/2304140030_TDK-CGA2B3X7R1H473KT0Y0F_C343051.pdf; ComponentLink2Description: JLCPCB Part URL; ComponentLink2URL: https://jlcpcb.com/partdetail/C343051; ComponentLink3Description: LCSC Part URL; ComponentLink3URL: https://lcsc.com/product-detail/Multilayer-Ceramic-Capacitors-MLCC---SMD-SMT_TDK-TDK-CGA2B3X7R1H473KT0Y0F_C343051.html
footprint CAP-0402 (0402 (1005M) Capacitor)
pins: 1, 2

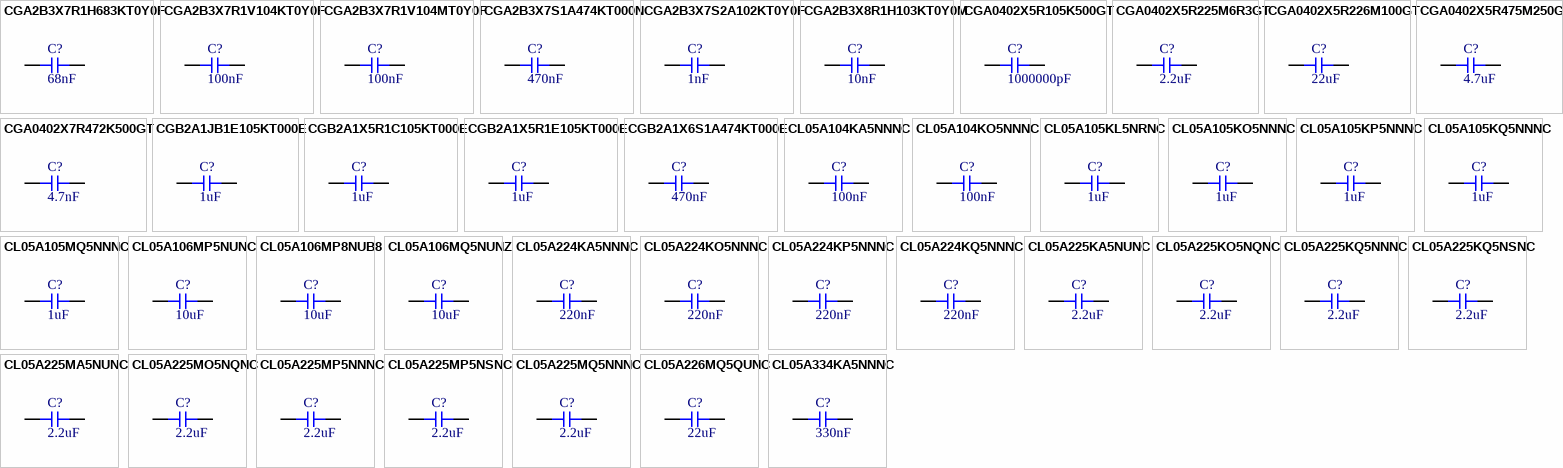
[diagram p44: symbols CGA2B3X7R1H683KT0Y0F to CL05A334KA5NNNC]

## CGA2B3X7R1H683KT0Y0F
designator C?  Capacitance: 68nF  (hidden comment: *)
Capacitor, Ceramic (MLCC), 68nF, ±10%, 50V, X7R, ±10%, SMD 0402; Manufacturer: TDK; Manufacturer Part Number: CGA2B3X7R1H683KT0Y0F; Package Size: 0402; JLCPCB Basic Part: No; JLCPCB Part Number: C695381; Supplier 1: LCSC; Category: Capacitors - MLCC; Supplier Part Number 1: C695381; Tolerance: ±10%; Voltage Rating: 50V; Temperature Coefficient: X7R; RoHS: Yes; ComponentLink1Description: Datasheet; ComponentLink1URL: https://wmsc.lcsc.com/wmsc/upload/file/pdf/v2/lcsc/2304140030_TDK-CGA2B3X7R1H683KT0Y0F_C695381.pdf; ComponentLink2Description: JLCPCB Part URL; ComponentLink2URL: https://jlcpcb.com/partdetail/C695381; ComponentLink3Description: LCSC Part URL; ComponentLink3URL: https://lcsc.com/product-detail/Multilayer-Ceramic-Capacitors-MLCC---SMD-SMT_TDK-TDK-CGA2B3X7R1H683KT0Y0F_C695381.html
footprint CAP-0402 (0402 (1005M) Capacitor)
pins: 1, 2

## CGA2B3X7R1V104KT0Y0F
designator C?  Capacitance: 100nF  (hidden comment: *)
Capacitor, Ceramic (MLCC), 100nF, ±10%, 35V, X7R, ±10%, SMD 0402; Manufacturer: TDK; Manufacturer Part Number: CGA2B3X7R1V104KT0Y0F; Package Size: 0402; JLCPCB Basic Part: No; JLCPCB Part Number: C343047; Supplier 1: LCSC; Category: Capacitors - MLCC; Supplier Part Number 1: C343047; Tolerance: ±10%; Voltage Rating: 35V; Temperature Coefficient: X7R; RoHS: Yes; ComponentLink1Description: Datasheet; ComponentLink1URL: https://wmsc.lcsc.com/wmsc/upload/file/pdf/v2/lcsc/2208251730_TDK-CGA2B3X7R1V104KT0Y0F_C343047.pdf; ComponentLink2Description: JLCPCB Part URL; ComponentLink2URL: https://jlcpcb.com/partdetail/C343047; ComponentLink3Description: LCSC Part URL; ComponentLink3URL: https://lcsc.com/product-detail/Multilayer-Ceramic-Capacitors-MLCC---SMD-SMT_TDK-TDK-CGA2B3X7R1V104KT0Y0F_C343047.html
footprint CAP-0402 (0402 (1005M) Capacitor)
pins: 1, 2

## CGA2B3X7R1V104MT0Y0F
designator C?  Capacitance: 100nF  (hidden comment: *)
Capacitor, Ceramic (MLCC), 100nF, ±20%, 35V, X7R, ±20%, SMD 0402; Manufacturer: TDK; Manufacturer Part Number: CGA2B3X7R1V104MT0Y0F; Package Size: 0402; JLCPCB Basic Part: No; JLCPCB Part Number: C2802700; Supplier 1: LCSC; Category: Capacitors - MLCC; Supplier Part Number 1: C2802700; Tolerance: ±20%; Voltage Rating: 35V; Temperature Coefficient: X7R; RoHS: Yes; ComponentLink1Description: Datasheet; ComponentLink1URL: https://wmsc.lcsc.com/wmsc/upload/file/pdf/v2/lcsc/2106031738_TDK-CGA2B3X7R1V104MT0Y0F_C2802700.pdf; ComponentLink2Description: JLCPCB Part URL; ComponentLink2URL: https://jlcpcb.com/partdetail/C2802700; ComponentLink3Description: LCSC Part URL; ComponentLink3URL: https://lcsc.com/product-detail/Multilayer-Ceramic-Capacitors-MLCC---SMD-SMT_TDK-TDK-CGA2B3X7R1V104MT0Y0F_C2802700.html
footprint CAP-0402 (0402 (1005M) Capacitor)
pins: 1, 2

## CGA2B3X7S1A474KT000N
designator C?  Capacitance: 470nF  (hidden comment: *)
Capacitor, Ceramic (MLCC), 470nF, ±10%, 10V, X7S, ±10%, SMD 0402; Manufacturer: TDK; Manufacturer Part Number: CGA2B3X7S1A474KT000N; Package Size: 0402; JLCPCB Basic Part: No; JLCPCB Part Number: C445733; Supplier 1: LCSC; Category: Capacitors - MLCC; Supplier Part Number 1: C445733; Tolerance: ±10%; Voltage Rating: 10V; Temperature Coefficient: X7S; RoHS: Yes; ComponentLink1Description: Datasheet; ComponentLink1URL: https://wmsc.lcsc.com/wmsc/upload/file/pdf/v2/lcsc/2304140030_TDK-CGA2B3X7S1A474KT000N_C445733.pdf; ComponentLink2Description: JLCPCB Part URL; ComponentLink2URL: https://jlcpcb.com/partdetail/C445733; ComponentLink3Description: LCSC Part URL; ComponentLink3URL: https://lcsc.com/product-detail/Multilayer-Ceramic-Capacitors-MLCC---SMD-SMT_TDK-TDK-CGA2B3X7S1A474KT000N_C445733.html
footprint CAP-0402 (0402 (1005M) Capacitor)
pins: 1, 2

## CGA2B3X7S2A102KT0Y0F
designator C?  Capacitance: 1nF  (hidden comment: *)
Capacitor, Ceramic (MLCC), 1nF, ±10%, 100V, X7S, ±10%, SMD 0402; Manufacturer: TDK; Manufacturer Part Number: CGA2B3X7S2A102KT0Y0F; Package Size: 0402; JLCPCB Basic Part: No; JLCPCB Part Number: C445751; Supplier 1: LCSC; Category: Capacitors - MLCC; Supplier Part Number 1: C445751; Tolerance: ±10%; Voltage Rating: 100V; Temperature Coefficient: X7S; RoHS: Yes; ComponentLink1Description: Datasheet; ComponentLink1URL: https://wmsc.lcsc.com/wmsc/upload/file/pdf/v2/lcsc/2304140030_TDK-CGA2B3X7S2A102KT0Y0F_C445751.pdf; ComponentLink2Description: JLCPCB Part URL; ComponentLink2URL: https://jlcpcb.com/partdetail/C445751; ComponentLink3Description: LCSC Part URL; ComponentLink3URL: https://lcsc.com/product-detail/Multilayer-Ceramic-Capacitors-MLCC---SMD-SMT_TDK-TDK-CGA2B3X7S2A102KT0Y0F_C445751.html
footprint CAP-0402 (0402 (1005M) Capacitor)
pins: 1, 2

## CGA2B3X8R1H103KT0Y0M
designator C?  Capacitance: 10nF  (hidden comment: *)
Capacitor, Ceramic (MLCC), 10nF, ±10%, 50V, X8R, ±10%, SMD 0402; Manufacturer: TDK; Manufacturer Part Number: CGA2B3X8R1H103KT0Y0M; Package Size: 0402; JLCPCB Basic Part: No; JLCPCB Part Number: C694493; Supplier 1: LCSC; Category: Capacitors - MLCC; Supplier Part Number 1: C694493; Tolerance: ±10%; Voltage Rating: 50V; Temperature Coefficient: X8R; RoHS: Yes; ComponentLink1Description: Datasheet; ComponentLink1URL: https://wmsc.lcsc.com/wmsc/upload/file/pdf/v2/lcsc/2304140030_TDK-CGA2B3X8R1H103KT0Y0M_C694493.pdf; ComponentLink2Description: JLCPCB Part URL; ComponentLink2URL: https://jlcpcb.com/partdetail/C694493; ComponentLink3Description: LCSC Part URL; ComponentLink3URL: https://lcsc.com/product-detail/Multilayer-Ceramic-Capacitors-MLCC---SMD-SMT_TDK-TDK-CGA2B3X8R1H103KT0Y0M_C694493.html
footprint CAP-0402 (0402 (1005M) Capacitor)
pins: 1, 2

## CGA0402X5R105K500GT
designator C?  Capacitance: 1000000pF  (hidden comment: *)
Capacitor, Ceramic (MLCC), 1000000pF, ±10%, null, X5R, ±10%, SMD 0402; Manufacturer: HRE; Manufacturer Part Number: CGA0402X5R105K500GT; Package Size: 0402; JLCPCB Basic Part: No; JLCPCB Part Number: C6119811; Supplier 1: LCSC; Category: Capacitors - MLCC; Supplier Part Number 1: C6119811; Tolerance: ±10%; Voltage Rating: null; Temperature Coefficient: X5R; RoHS: Yes; ComponentLink1Description: Datasheet; ComponentLink2Description: JLCPCB Part URL; ComponentLink2URL: https://jlcpcb.com/partdetail/C6119811; ComponentLink3Description: LCSC Part URL; ComponentLink3URL: https://lcsc.com/product-detail/Multilayer-Ceramic-Capacitors-MLCC---SMD-SMT_HRE-HRE-CGA0402X5R105K500GT_C6119811.html
footprint CAP-0402 (0402 (1005M) Capacitor)
pins: 1, 2

## CGA0402X5R225M6R3GT
designator C?  Capacitance: 2.2uF  (hidden comment: *)
Capacitor, Ceramic (MLCC), 2.2uF, ±20%, 6.3V, X5R, ±20%, SMD 0402; Manufacturer: HRE; Manufacturer Part Number: CGA0402X5R225M6R3GT; Package Size: 0402; JLCPCB Basic Part: No; JLCPCB Part Number: C7503516; Supplier 1: LCSC; Category: Capacitors - MLCC; Supplier Part Number 1: C7503516; Tolerance: ±20%; Voltage Rating: 6.3V; Temperature Coefficient: X5R; RoHS: Yes; ComponentLink1Description: Datasheet; ComponentLink2Description: JLCPCB Part URL; ComponentLink2URL: https://jlcpcb.com/partdetail/C7503516; ComponentLink3Description: LCSC Part URL; ComponentLink3URL: https://lcsc.com/product-detail/Multilayer-Ceramic-Capacitors-MLCC---SMD-SMT_HRE-HRE-CGA0402X5R225M6R3GT_C7503516.html
footprint CAP-0402 (0402 (1005M) Capacitor)
pins: 1, 2

## CGA0402X5R226M100GT
designator C?  Capacitance: 22uF  (hidden comment: *)
Capacitor, Ceramic (MLCC), 22uF, ±20%, 10V, X5R, ±20%, SMD 0402; Manufacturer: HRE; Manufacturer Part Number: CGA0402X5R226M100GT; Package Size: 0402; JLCPCB Basic Part: No; JLCPCB Part Number: C6119813; Supplier 1: LCSC; Category: Capacitors - MLCC; Supplier Part Number 1: C6119813; Tolerance: ±20%; Voltage Rating: 10V; Temperature Coefficient: X5R; RoHS: Yes; ComponentLink1Description: Datasheet; ComponentLink2Description: JLCPCB Part URL; ComponentLink2URL: https://jlcpcb.com/partdetail/C6119813; ComponentLink3Description: LCSC Part URL; ComponentLink3URL: https://lcsc.com/product-detail/Multilayer-Ceramic-Capacitors-MLCC---SMD-SMT_HRE-HRE-CGA0402X5R226M100GT_C6119813.html
footprint CAP-0402 (0402 (1005M) Capacitor)
pins: 1, 2

## CGA0402X5R475M250GT
designator C?  Capacitance: 4.7uF  (hidden comment: *)
Capacitor, Ceramic (MLCC), 4.7uF, ±20%, 25V, X5R, ±20%, SMD 0402; Manufacturer: HRE; Manufacturer Part Number: CGA0402X5R475M250GT; Package Size: 0402; JLCPCB Basic Part: No; JLCPCB Part Number: C6119795; Supplier 1: LCSC; Category: Capacitors - MLCC; Supplier Part Number 1: C6119795; Tolerance: ±20%; Voltage Rating: 25V; Temperature Coefficient: X5R; RoHS: Yes; ComponentLink1Description: Datasheet; ComponentLink2Description: JLCPCB Part URL; ComponentLink2URL: https://jlcpcb.com/partdetail/C6119795; ComponentLink3Description: LCSC Part URL; ComponentLink3URL: https://lcsc.com/product-detail/Multilayer-Ceramic-Capacitors-MLCC---SMD-SMT_HRE-HRE-CGA0402X5R475M250GT_C6119795.html
footprint CAP-0402 (0402 (1005M) Capacitor)
pins: 1, 2
